# Altium footprint library CONN_USB_C.PcbLib: 30 footprints (part 2 of 2)
Each footprint in its own frame and in the unit in brackets; x right, y up, seen from the top. Pads: shape width x height; smd on the part's side, far side on the other; paste and mask are expansions set on the pad; w line width, h text height; cw(c..) or ccw(c..) is an arc to the next point about the centre after c.
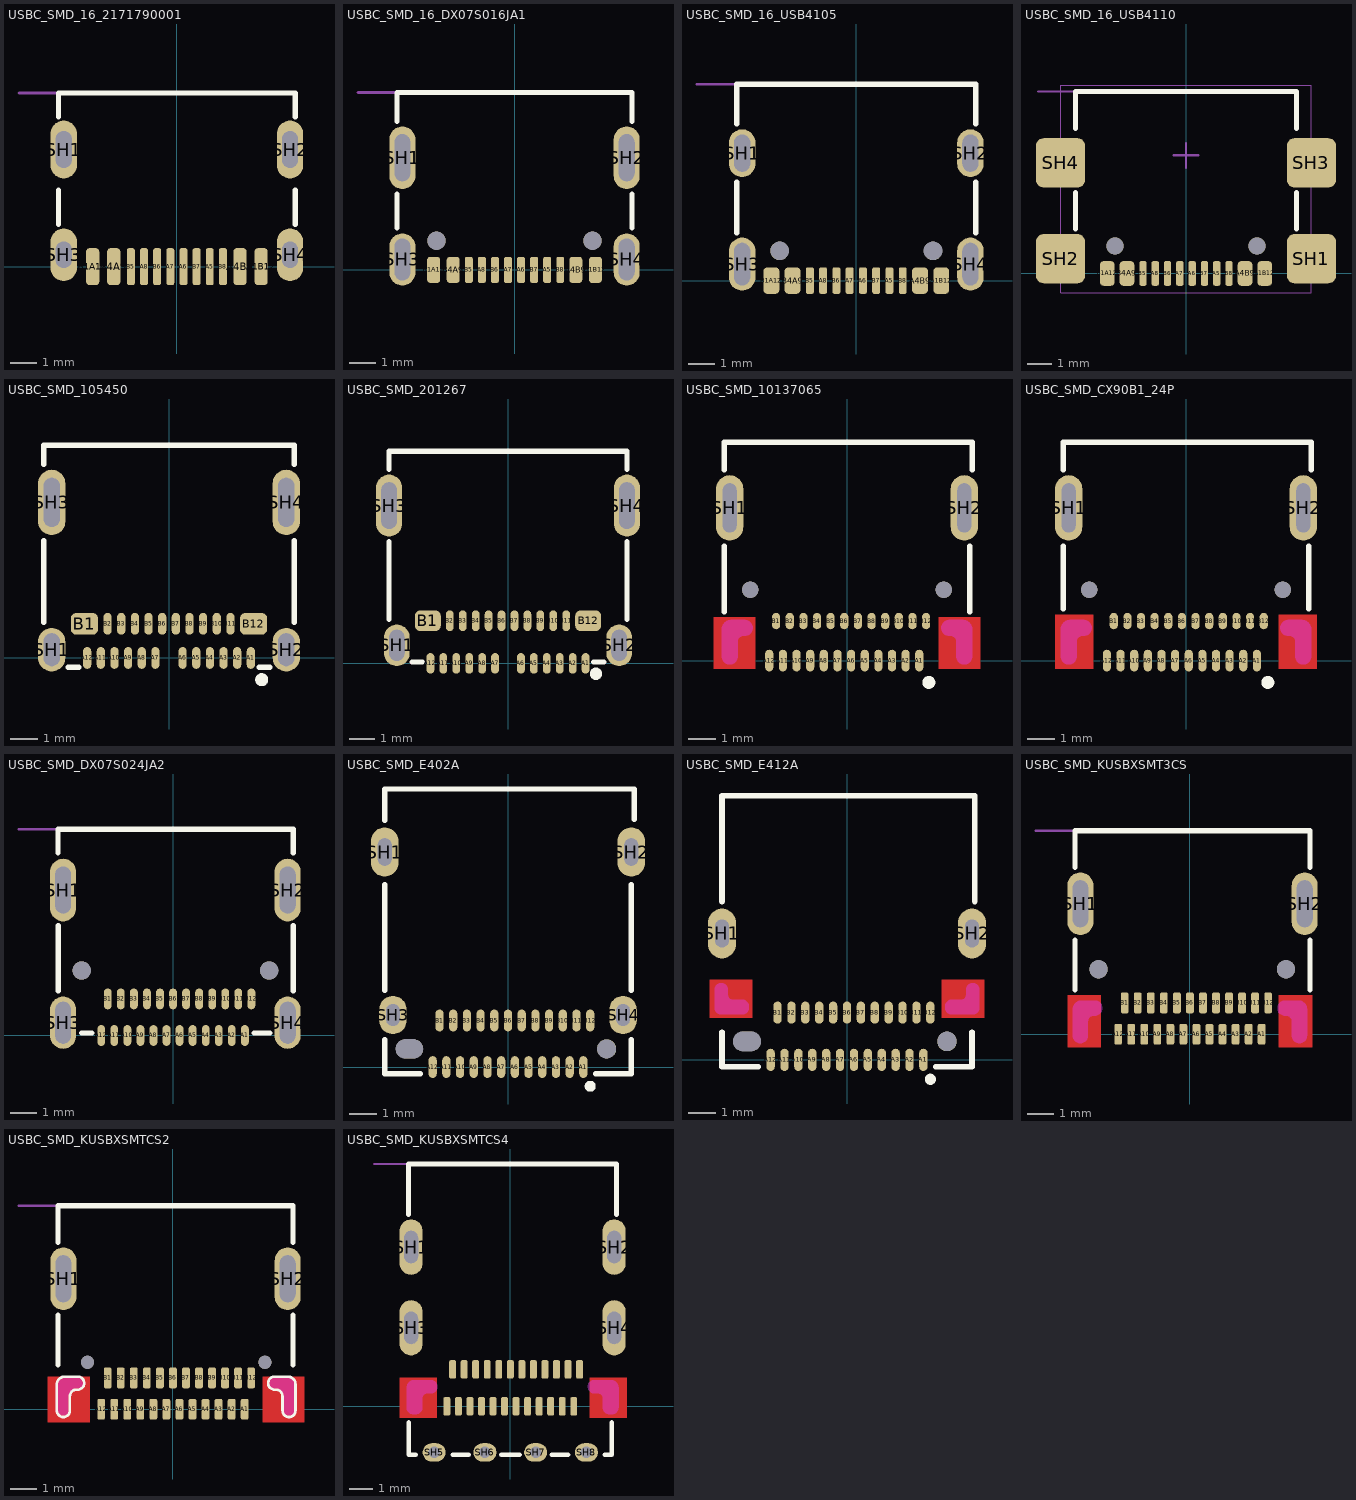
[diagram p1: the footprints below, top view; thin cyan lines are the x and y axes]

## USBC_SMD_16_2171790001 [mm] "CONN, USB, Type C, 2171790001"
height 3.31
pads (16):
  rrect50% 0.5x1.4 smd mask+0.075: A1B12(3.2,0) A4B9(2.4,0) B1A12(-3.2,0) B4A9(-2.4,0)
  rrect50% 0.3x1.4 smd mask+0.075: A5(1.25,0) A6(0.25,0) A7(-0.25,0) A8(-1.25,0) B5(-1.75,0) B6(-0.75,0) B7(0.75,0) B8(1.75,0)
  oval 1x2.2 hole 0.6 slot 1.4 at 90 deg: SH1(-4.3,4.45) SH2(4.3,4.45)
  oval 1x2 hole 0.6 slot 1 at 90 deg: SH3(-4.3,0.45) SH4(4.3,0.45)
Top Overlay:
  lines w0.2: -4.5,1.6 -4.5,2.9 ; -4.5,5.7 -4.5,6.6 4.5,6.6 4.5,5.7 ; 4.5,1.6 4.5,2.9
Mechanical 13:
  lines w0.1: -6,6.6 -4,6.6
  text "PCB EDGE" at -6,7 h0.8
3D body "2171790001.stp": height 3.27, standoff -0.79, extent -4.472,-0.175 4.471,6.575

## USBC_SMD_16_DX07S016JA1 [mm] "CONN, USB, Type C, DX07S016JA1, popular*"
height 3.31
pads (18):
  rrect50% 0.5x1 smd mask+0.075: A1B12(3.1,0) A4B9(2.35,0) B1A12(-3.1,0) B4A9(-2.35,0)
  rrect50% 0.3x1 smd mask+0.075: A5(1.25,0) A6(0.25,0) A7(-0.25,0) A8(-1.25,0) B5(-1.75,0) B6(-0.75,0) B7(0.75,0) B8(1.75,0)
  oval 1x2.4 hole 0.6 slot 1.8 at 90 deg: SH1(-4.3,4.3) SH2(4.3,4.3)
  oval 1x2 hole 0.6 slot 1.6 at 90 deg: SH3(-4.3,0.4) SH4(4.3,0.4)
  round 0.7 hole 0.7 unplated: ""(-2.99,1.12) ""(2.99,1.12)
Top Overlay:
  lines w0.2: -4.5,1.6 -4.5,2.9 ; -4.5,5.7 -4.5,6.8 4.5,6.8 4.5,5.7 ; 4.5,1.6 4.5,2.9
Mechanical 13:
  lines w0.1: -6,6.8 -4,6.8
  text "PCB EDGE" at -6,7.2 h0.8
3D body "DX07S016JA1.STEP": height 3.18, standoff -0.88, extent -4.47,-0.2 4.47,6.7

## USBC_SMD_16_USB4105 [mm] "CONN, USB, Type C, USB4105, popular*"
height 3.31
pads (18):
  rrect50% 0.6x1 smd mask+0.075: A1B12(3.2,0) A4B9(2.4,0) B1A12(-3.2,0) B4A9(-2.4,0)
  rrect50% 0.3x1 smd mask+0.075: A5(1.25,0) A6(0.25,0) A7(-0.25,0) A8(-1.25,0) B5(-1.75,0) B6(-0.75,0) B7(0.75,0) B8(1.75,0)
  oval 1x1.8 hole 0.6 slot 1.4 at 90 deg: SH1(-4.3,4.8) SH2(4.3,4.8)
  oval 1x2 hole 0.6 slot 1.6 at 90 deg: SH3(-4.3,0.62) SH4(4.3,0.62)
  round 0.7 hole 0.7 unplated: ""(-2.89,1.12) ""(2.89,1.12)
Top Overlay:
  lines w0.2: -4.5,1.8 -4.5,3.7 ; -4.5,5.9 -4.5,7.4 4.5,7.4 4.5,5.9 ; 4.5,1.8 4.5,3.7
Mechanical 13:
  lines w0.1: -6,7.4 -4,7.4
  text "PCB EDGE" at -6,7.8 h0.8
3D body "USB4105-15-A.stp": height 3.26, standoff -0.9, extent -4.79,-0.3 4.79,7.408

## USBC_SMD_16_USB4110 [mm] "CONN, USB, Type C, USB4110"
height 3.26
pads (18):
  rrect50% 0.6x1 smd mask+0.075: A1B12(3.2,0) A4B9(2.4,0) B1A12(-3.2,0) B4A9(-2.4,0)
  rrect50% 0.3x1 smd mask+0.075: A5(1.25,0) A6(0.25,0) A7(-0.25,0) A8(-1.25,0) B5(-1.75,0) B6(-0.75,0) B7(0.75,0) B8(1.75,0)
  rrect30% 2x2 smd: SH1(5.1,0.6) SH2(-5.1,0.6) SH3(5.1,4.5) SH4(-5.1,4.5)
  round 0.7 hole 0.7 unplated: ""(-2.89,1.12) ""(2.89,1.12)
Top Overlay:
  lines w0.2: -4.5,1.8 -4.5,3.3 ; -4.5,5.9 -4.5,7.4 4.5,7.4 4.5,5.9 ; 4.5,1.8 4.5,3.3
Mechanical 13:
  lines w0.1: -6,7.4 -4,7.4
  text "PCB EDGE" at -6,7.8 h0.8
Mechanical 15:
  lines w0.05: -5.1,-0.78 -5.1,7.65 5.1,7.65 5.1,-0.78 -5.1,-0.78
  lines w0.1: -0.5,4.8 0.5,4.8 ; 0,4.3 0,5.3
3D body "USB4110-GF-A.stp": height 3.23, standoff -0.72, extent -5.65,-0.28 5.65,7.396

## USBC_SMD_105450 [mm] "CONN, USB, Type C, SMD"
height 2.96
pads (28):
  oval 0.3x0.8 smd mask+0.075: A1(3,0) A2(2.5,0) A3(2,0) A4(1.5,0) A5(1,0) A6(0.5,0) A7(-0.5,0) A8(-1,0) A9(-1.5,0) A10(-2,0) A11(-2.5,0) A12(-3,0) B2(-2.25,1.25) B3(-1.75,1.25) B4(-1.25,1.25) B5(-0.75,1.25) B6(-0.25,1.25) B7(0.25,1.25) B8(0.75,1.25) B9(1.25,1.25) B10(1.75,1.25) B11(2.25,1.25)
  rrect50% 1x0.8 smd mask+0.075: B1(-3.1,1.25) B12(3.1,1.25)
  oval 1x1.6 hole 0.6 slot 1.2 at 90 deg: SH1(-4.3,0.3) SH2(4.3,0.3)
  oval 1x2.4 hole 0.6 slot 1.8 at 90 deg: SH3(-4.3,5.7) SH4(4.3,5.7)
Top Overlay:
  circle w0.25: c3.4,-0.8 r0.114
  lines w0.2: -4.6,1.3 -4.6,4.3 ; -4.6,7.1 -4.6,7.8 4.6,7.8 4.6,7.1 ; -3.7,-0.35 -3.3,-0.35 ; 3.3,-0.35 3.7,-0.35 ; 4.6,1.3 4.6,4.3
3D body "105450-0101.stp": height 3.23, standoff -0.73, extent -4.47,-0.25 4.47,7.65

## USBC_SMD_201267 [mm] "CONN, USB, Type C, SMD"
height 2.96
pads (28):
  oval 0.3x0.8 smd mask+0.075: A1(3,0) A2(2.5,0) A3(2,0) A4(1.5,0) A5(1,0) A6(0.5,0) A7(-0.5,0) A8(-1,0) A9(-1.5,0) A10(-2,0) A11(-2.5,0) A12(-3,0) B2(-2.25,1.65) B3(-1.75,1.65) B4(-1.25,1.65) B5(-0.75,1.65) B6(-0.25,1.65) B7(0.25,1.65) B8(0.75,1.65) B9(1.25,1.65) B10(1.75,1.65) B11(2.25,1.65)
  rrect50% 1x0.8 smd mask+0.075: B1(-3.1,1.65) B12(3.1,1.65)
  oval 1x1.6 hole 0.6 slot 1.2 at 90 deg: SH1(-4.3,0.7) SH2(4.3,0.7)
  oval 1x2.4 hole 0.6 slot 1.8 at 90 deg: SH3(-4.6,6.1) SH4(4.6,6.1)
Top Overlay:
  circle w0.25: c3.4,-0.4 r0.114
  lines w0.2: -4.6,1.7 -4.6,4.7 ; -4.6,7.5 -4.6,8.2 4.6,8.2 4.6,7.5 ; -3.7,0.05 -3.3,0.05 ; 3.3,0.05 3.7,0.05 ; 4.6,1.7 4.6,4.7
3D body "2012670005-000.stp": height 3.72, standoff -2.29, extent -4.695,-0.3 4.695,8

## USBC_SMD_10137065 [mm] "CONN, USB, Type C, SMD"
height 2.96
pads (28):
  oval 0.3x0.8 smd mask+0.075: A1(2.65,0) A2(2.15,0) A3(1.65,0) A4(1.15,0) A5(0.65,0) A6(0.15,0) A7(-0.35,0) A8(-0.85,0) A9(-1.35,0) A10(-1.85,0) A11(-2.35,0) A12(-2.85,0)
  oval 0.3x0.6 smd mask+0.075: B1(-2.6,1.45) B2(-2.1,1.45) B3(-1.6,1.45) B4(-1.1,1.45) B5(-0.6,1.45) B6(-0.1,1.45) B7(0.4,1.45) B8(0.9,1.45) B9(1.4,1.45) B10(1.9,1.45) B11(2.4,1.45) B12(2.9,1.45)
  oval 1x2.4 hole 0.5 slot 1.8 at 90 deg: SH1(-4.3,5.6) SH2(4.3,5.6)
  round 0.6 hole 0.6 unplated: ""(-3.55,2.6) ""(3.55,2.6)
Top Layer:
  rectangle: 3.35,-0.3 4.9,1.6
  region: -3.35,1.6 -4.9,1.6 -4.9,-0.3 -3.35,-0.3
Top Overlay:
  circle w0.25: c3,-0.8 r0.114
  lines w0.2: -4.5,1.8 -4.5,4.2 ; -4.5,7 -4.5,8 4.6,8 4.6,7 ; 4.5,1.8 4.5,4.2
Keep-Out Layer:
  board cut-out: 4.3,-0.1 4.35,-0.1 4.442,-0.062 4.512,0.008 4.55,0.1 4.55,0.15 4.55,1.15 4.55,1.21 4.504,1.32 4.42,1.404 4.31,1.45 4.25,1.45 3.75,1.45 3.7,1.45 3.608,1.412 3.538,1.342 3.5,1.25 3.5,1.2 3.5,1.15 3.538,1.058 3.608,0.988 3.7,0.95 3.75,0.95 3.8,0.95 3.849,0.945 3.939,0.908 4.008,0.839 4.045,0.749 4.05,0.7 4.05,0.15 4.05,0.1 4.088,0.008 4.158,-0.062 4.25,-0.1
  board cut-out: -4.3,-0.1 -4.35,-0.1 -4.442,-0.062 -4.512,0.008 -4.55,0.1 -4.55,0.15 -4.55,1.15 -4.55,1.21 -4.504,1.32 -4.42,1.404 -4.31,1.45 -4.25,1.45 -3.75,1.45 -3.7,1.45 -3.608,1.412 -3.538,1.342 -3.5,1.25 -3.5,1.2 -3.5,1.15 -3.538,1.058 -3.608,0.988 -3.7,0.95 -3.75,0.95 -3.8,0.95 -3.849,0.945 -3.939,0.908 -4.008,0.839 -4.045,0.749 -4.05,0.7 -4.05,0.15 -4.05,0.1 -4.088,0.008 -4.158,-0.062 -4.25,-0.1
  lines w0.1: -4.55,0.15 ccw(c-4.3,0.15) -4.3,-0.1 ccw(c-4.3,0.15) -4.05,0.15 -4.05,0.7 cw(c-3.8,0.7) -3.8,0.95 -3.75,0.95 ccw(c-3.75,1.2) -3.5,1.2 ccw(c-3.75,1.2) -3.75,1.45 -4.25,1.45 ccw(c-4.25,1.15) -4.55,1.15 -4.55,0.15 ; 3.5,1.2 cw(c3.75,1.2) 3.75,1.45 4.25,1.45 cw(c4.25,1.15) 4.55,1.15 4.55,0.15 cw(c4.3,0.15) 4.3,-0.1 cw(c4.3,0.15) 4.05,0.15 4.05,0.7 ccw(c3.8,0.7) 3.8,0.95 3.75,0.95 cw(c3.75,1.2) 3.5,1.2
3D body "10137065..stp": height 3.21, standoff -0.55, extent -4.445,-0.2 4.495,7.95

## USBC_SMD_CX90B1_24P [mm] "CONN, USB, Type C, SMD, CX90B1-24P"
height 2.96
pads (28):
  oval 0.3x0.8 smd mask+0.075: A1(2.6,0) A2(2.1,0) A3(1.6,0) A4(1.1,0) A5(0.6,0) A6(0.1,0) A7(-0.4,0) A8(-0.9,0) A9(-1.4,0) A10(-1.9,0) A11(-2.4,0) A12(-2.9,0)
  oval 0.3x0.6 smd mask+0.075: B1(-2.65,1.45) B2(-2.15,1.45) B3(-1.65,1.45) B4(-1.15,1.45) B5(-0.65,1.45) B6(-0.15,1.45) B7(0.35,1.45) B8(0.85,1.45) B9(1.35,1.45) B10(1.85,1.45) B11(2.35,1.45) B12(2.85,1.45)
  oval 1x2.4 hole 0.5 slot 1.8 at 90 deg: SH1(-4.3,5.6) SH2(4.3,5.6)
  round 0.6 hole 0.6 unplated: ""(-3.55,2.6) ""(3.55,2.6)
Top Layer:
  region: 4.8,1.7 3.4,1.7 3.4,-0.3 4.8,-0.3
  rectangle: -4.8,-0.3 -3.4,1.7
Top Overlay:
  circle w0.25: c3,-0.8 r0.114
  lines w0.2: -4.5,1.9 -4.5,4.2 ; -4.5,7 -4.5,8 4.6,8 4.6,7 ; 4.5,1.9 4.5,4.2
Keep-Out Layer:
  board cut-out: -4.3,-0.1 -4.35,-0.1 -4.442,-0.062 -4.512,0.008 -4.55,0.1 -4.55,0.15 -4.55,1.15 -4.55,1.21 -4.504,1.32 -4.42,1.404 -4.31,1.45 -4.25,1.45 -3.75,1.45 -3.7,1.45 -3.608,1.412 -3.538,1.342 -3.5,1.25 -3.5,1.2 -3.5,1.15 -3.538,1.058 -3.608,0.988 -3.7,0.95 -3.75,0.95 -3.8,0.95 -3.849,0.945 -3.939,0.908 -4.008,0.839 -4.045,0.749 -4.05,0.7 -4.05,0.15 -4.05,0.1 -4.088,0.008 -4.158,-0.062 -4.25,-0.1
  board cut-out: 4.3,-0.1 4.35,-0.1 4.442,-0.062 4.512,0.008 4.55,0.1 4.55,0.15 4.55,1.15 4.55,1.21 4.504,1.32 4.42,1.404 4.31,1.45 4.25,1.45 3.75,1.45 3.7,1.45 3.608,1.412 3.538,1.342 3.5,1.25 3.5,1.2 3.5,1.15 3.538,1.058 3.608,0.988 3.7,0.95 3.75,0.95 3.8,0.95 3.849,0.945 3.939,0.908 4.008,0.839 4.045,0.749 4.05,0.7 4.05,0.15 4.05,0.1 4.088,0.008 4.158,-0.062 4.25,-0.1
  lines w0.1: -4.55,0.15 ccw(c-4.3,0.15) -4.3,-0.1 ccw(c-4.3,0.15) -4.05,0.15 -4.05,0.7 cw(c-3.8,0.7) -3.8,0.95 -3.75,0.95 ccw(c-3.75,1.2) -3.5,1.2 ccw(c-3.75,1.2) -3.75,1.45 -4.25,1.45 ccw(c-4.25,1.15) -4.55,1.15 -4.55,0.15 ; 3.5,1.2 cw(c3.75,1.2) 3.75,1.45 4.25,1.45 cw(c4.25,1.15) 4.55,1.15 4.55,0.15 cw(c4.3,0.15) 4.3,-0.1 cw(c4.3,0.15) 4.05,0.15 4.05,0.7 ccw(c3.8,0.7) 3.8,0.95 3.75,0.95 cw(c3.75,1.2) 3.5,1.2
3D body "CX90B1-24P.stp": height 3.19, standoff -0.57, extent -4.495,-0.2 4.445,7.95

## USBC_SMD_DX07S024JA2 [mm] "CONN, USB, Type C, DX07S024JA2"
height 3.31
pads (30):
  oval 0.3x0.8 smd mask+0.075: A1(2.75,0) A2(2.25,0) A3(1.75,0) A4(1.25,0) A5(0.75,0) A6(0.25,0) A7(-0.25,0) A8(-0.75,0) A9(-1.25,0) A10(-1.75,0) A11(-2.25,0) A12(-2.75,0) B1(-2.5,1.4) B2(-2,1.4) B3(-1.5,1.4) B4(-1,1.4) B5(-0.5,1.4) B6(0,1.4) B7(0.5,1.4) B8(1,1.4) B9(1.5,1.4) B10(2,1.4) B11(2.5,1.4) B12(3,1.4)
  oval 1x2.4 hole 0.6 slot 1.8 at 90 deg: SH1(-4.21,5.57) SH2(4.39,5.57)
  oval 1x2 hole 0.6 slot 1.6 at 90 deg: SH3(-4.21,0.49) SH4(4.39,0.49)
  round 0.7 hole 0.7 unplated: ""(-3.5,2.49) ""(3.68,2.49)
Top Overlay:
  lines w0.2: -4.41,7 -4.41,7.9 4.6,7.9 4.6,7 ; -4.4,1.7 -4.4,4.2 ; -3.5,0.1 -3.1,0.1 ; 3.1,0.1 3.7,0.1 ; 4.6,1.7 4.6,4.2
Mechanical 13:
  lines w0.1: -5.9,7.9 -3.9,7.9
  text "PCB EDGE" at -5.8,8.1 h0.8
3D body "DX07S024JA2.STEP": height 3.17, standoff -1.17, extent -4.355,-0.3 4.585,7.87

## USBC_SMD_E402A [mm] "CONN, USB, Type C, SMD, 12401598E4#2A, 12401610E4#2A"
height 3.2
pads (30):
  oval 0.3x0.8 smd mask+0.075: A1(2.75,0) A2(2.25,0) A3(1.75,0) A4(1.25,0) A5(0.75,0) A6(0.25,0) A7(-0.25,0) A8(-0.75,0) A9(-1.25,0) A10(-1.75,0) A11(-2.25,0) A12(-2.75,0) B1(-2.5,1.7) B2(-2,1.7) B3(-1.5,1.7) B4(-1,1.7) B5(-0.5,1.7) B6(0,1.7) B7(0.5,1.7) B8(1,1.7) B9(1.5,1.7) B10(2,1.7) B11(2.5,1.7) B12(3,1.7)
  oval 1x1.8 hole 0.5 slot 1 at 90 deg: SH1(-4.5,7.85) SH2(4.5,7.85)
  oval 1x1.4 hole 0.5 slot 0.8 at 90 deg: SH3(-4.2,1.9) SH4(4.2,1.9)
  oval 1x0.7 hole 0.7 slot 1 at 0 deg unplated mask+0.05: ""(-3.6,0.665)
  round 0.7 hole 0.7 unplated mask+0.05: ""(3.6,0.665)
Top Overlay:
  circle w0.2: c3,-0.7 r0.1
  lines w0.2: -4.5,1 -4.5,-0.25 -3.2,-0.25 ; -4.5,2.8 -4.5,6.65 ; -4.5,9 -4.5,10.15 4.6,10.15 4.6,9.05 ; 3.2,-0.25 4.5,-0.25 4.5,1 ; 4.5,2.8 4.5,6.65
3D body "12401610E4#2A.step": height 3.3, standoff -1.28, extent -4.6,-0.3 4.6,10.25

## USBC_SMD_E412A [mm] "CONN, USB, Type C, SMD, 12401899E412A"
height 3.2
pads (28):
  oval 0.3x0.8 smd mask+0.075: A1(2.75,0) A2(2.25,0) A3(1.75,0) A4(1.25,0) A5(0.75,0) A6(0.25,0) A7(-0.25,0) A8(-0.75,0) A9(-1.25,0) A10(-1.75,0) A11(-2.25,0) A12(-2.75,0) B1(-2.5,1.7) B2(-2,1.7) B3(-1.5,1.7) B4(-1,1.7) B5(-0.5,1.7) B6(0,1.7) B7(0.5,1.7) B8(1,1.7) B9(1.5,1.7) B10(2,1.7) B11(2.5,1.7) B12(3,1.7)
  oval 1x1.8 hole 0.5 slot 1 at 90 deg: SH1(-4.5,4.55) SH2(4.5,4.55)
  oval 1x0.7 hole 0.7 slot 1 at 0 deg unplated mask+0.05: ""(-3.6,0.665)
  round 0.7 hole 0.7 unplated mask+0.05: ""(3.6,0.665)
Top Layer:
  rectangle: -4.95,1.5 -3.4,2.9
  region: 4.95,2.9 3.4,2.9 3.4,1.5 4.95,1.5
Top Overlay:
  circle w0.2: c3,-0.7 r0.1
  lines w0.2: -4.5,1 -4.5,-0.25 -3.2,-0.25 ; -4.5,5.7 -4.5,9.5 4.6,9.5 4.6,5.7 ; 3.2,-0.25 4.5,-0.25 4.5,1
Keep-Out Layer:
  board cut-out: 4.525,1.675 4.565,1.675 4.638,1.705 4.695,1.762 4.725,1.835 4.725,1.875 4.725,2.525 4.725,2.565 4.695,2.638 4.638,2.695 4.565,2.725 4.525,2.725 4.485,2.725 4.412,2.695 4.355,2.638 4.325,2.565 4.325,2.525 4.325,2.325 4.321,2.286 4.291,2.214 4.236,2.159 4.164,2.129 4.125,2.125 3.775,2.125 3.735,2.125 3.662,2.095 3.605,2.038 3.575,1.965 3.575,1.925 3.575,1.875 3.575,1.835 3.605,1.762 3.662,1.705 3.735,1.675 3.775,1.675
  board cut-out: -4.525,1.675 -4.565,1.675 -4.638,1.705 -4.695,1.762 -4.725,1.835 -4.725,1.875 -4.725,2.525 -4.725,2.565 -4.695,2.638 -4.638,2.695 -4.565,2.725 -4.525,2.725 -4.485,2.725 -4.412,2.695 -4.355,2.638 -4.325,2.565 -4.325,2.525 -4.325,2.325 -4.321,2.286 -4.291,2.214 -4.236,2.159 -4.164,2.129 -4.125,2.125 -3.775,2.125 -3.735,2.125 -3.662,2.095 -3.605,2.038 -3.575,1.965 -3.575,1.925 -3.575,1.875 -3.575,1.835 -3.605,1.762 -3.662,1.705 -3.735,1.675 -3.775,1.675
  lines w0.1: -4.725,1.875 ccw(c-4.525,1.875) -4.525,1.675 -3.775,1.675 ccw(c-3.775,1.875) -3.575,1.875 -3.575,1.925 ccw(c-3.775,1.925) -3.775,2.125 -4.125,2.125 cw(c-4.125,2.325) -4.325,2.325 -4.325,2.525 ccw(c-4.525,2.525) -4.525,2.725 ccw(c-4.525,2.525) -4.725,2.525 -4.725,1.875 ; 3.575,1.875 ccw(c3.775,1.875) 3.775,1.675 4.525,1.675 ccw(c4.525,1.875) 4.725,1.875 4.725,2.525 ccw(c4.525,2.525) 4.525,2.725 ccw(c4.525,2.525) 4.325,2.525 4.325,2.325 cw(c4.125,2.325) 4.125,2.125 3.775,2.125 ccw(c3.775,1.925) 3.575,1.925 3.575,1.875
3D body "12401899.stp": height 3.45, standoff -0.9, extent -4.59,-0.3 4.59,9.35

## USBC_SMD_KUSBXSMT3CS [mm] "CONN, USB, Type C, KUSBX-SMT3-CS"
height 3.31
pads (28):
  rrect50% 0.3x0.8 smd mask+0.075: A1(2.75,0) A2(2.25,0) A3(1.75,0) A4(1.25,0) A5(0.75,0) A6(0.25,0) A7(-0.25,0) A8(-0.75,0) A9(-1.25,0) A10(-1.75,0) A11(-2.25,0) A12(-2.75,0) B1(-2.5,1.2) B2(-2,1.2) B3(-1.5,1.2) B4(-1,1.2) B5(-0.5,1.2) B6(0,1.2) B7(0.5,1.2) B8(1,1.2) B9(1.5,1.2) B10(2,1.2) B11(2.5,1.2) B12(3,1.2)
  oval 1x2.4 hole 0.6 slot 1.8 at 90 deg: SH1(-4.2,5) SH2(4.4,5)
  round 0.7 hole 0.7 unplated: ""(-3.5,2.49) ""(3.68,2.49)
Top Layer:
  rectangle: -4.7,-0.5 -3.4,1.5
  region: 4.7,1.5 3.4,1.5 3.4,-0.5 4.7,-0.5
Top Overlay:
  lines w0.2: -4.41,6.4 -4.41,7.8 4.6,7.8 4.6,6.4 ; -4.4,1.7 -4.4,3.6 ; 4.6,1.7 4.6,3.6
Keep-Out Layer:
  board cut-out: -4.2,-0.3 -4.25,-0.3 -4.342,-0.262 -4.412,-0.192 -4.45,-0.1 -4.45,-0.05 -4.45,0.95 -4.45,1.01 -4.404,1.12 -4.32,1.204 -4.21,1.25 -4.15,1.25 -3.65,1.25 -3.6,1.25 -3.508,1.212 -3.438,1.142 -3.4,1.05 -3.4,1 -3.4,0.95 -3.438,0.858 -3.508,0.788 -3.6,0.75 -3.65,0.75 -3.7,0.75 -3.749,0.745 -3.839,0.708 -3.908,0.639 -3.945,0.549 -3.95,0.5 -3.95,-0.05 -3.95,-0.1 -3.988,-0.192 -4.058,-0.262 -4.15,-0.3
  board cut-out: 4.2,-0.3 4.25,-0.3 4.342,-0.262 4.412,-0.192 4.45,-0.1 4.45,-0.05 4.45,0.95 4.45,1.01 4.404,1.12 4.32,1.204 4.21,1.25 4.15,1.25 3.65,1.25 3.6,1.25 3.508,1.212 3.438,1.142 3.4,1.05 3.4,1 3.4,0.95 3.438,0.858 3.508,0.788 3.6,0.75 3.65,0.75 3.7,0.75 3.749,0.745 3.839,0.708 3.908,0.639 3.945,0.549 3.95,0.5 3.95,-0.05 3.95,-0.1 3.988,-0.192 4.058,-0.262 4.15,-0.3
  lines w0.1: -4.45,-0.05 ccw(c-4.2,-0.05) -4.2,-0.3 ccw(c-4.2,-0.05) -3.95,-0.05 -3.95,0.5 cw(c-3.7,0.5) -3.7,0.75 -3.65,0.75 ccw(c-3.65,1) -3.4,1 ccw(c-3.65,1) -3.65,1.25 -4.15,1.25 ccw(c-4.15,0.95) -4.45,0.95 -4.45,-0.05 ; 3.4,1 cw(c3.65,1) 3.65,1.25 4.15,1.25 cw(c4.15,0.95) 4.45,0.95 4.45,-0.05 cw(c4.2,-0.05) 4.2,-0.3 cw(c4.2,-0.05) 3.95,-0.05 3.95,0.5 ccw(c3.7,0.5) 3.7,0.75 3.65,0.75 cw(c3.65,1) 3.4,1
Mechanical 13:
  lines w0.1: -5.9,7.8 -3.9,7.8
  text "PCB EDGE" at -5.8,8 h0.8
3D body "KUSBX-SMT3-CS.STEP": height 3.21, standoff -1.95, extent -4.345,-0.4 4.595,7.7

## USBC_SMD_KUSBXSMTCS2 [mm] "CONN, USB, Type C, KUSBX-SMT-CS2"
height 3.31
pads (28):
  rrect50% 0.3x0.8 smd mask+0.075: A1(2.75,0) A2(2.25,0) A3(1.75,0) A4(1.25,0) A5(0.75,0) A6(0.25,0) A7(-0.25,0) A8(-0.75,0) A9(-1.25,0) A10(-1.75,0) A11(-2.25,0) A12(-2.75,0) B1(-2.5,1.2) B2(-2,1.2) B3(-1.5,1.2) B4(-1,1.2) B5(-0.5,1.2) B6(0,1.2) B7(0.5,1.2) B8(1,1.2) B9(1.5,1.2) B10(2,1.2) B11(2.5,1.2) B12(3,1.2)
  oval 1x2.4 hole 0.6 slot 1.8 at 90 deg: SH1(-4.2,5) SH2(4.4,5)
  round 0.5 hole 0.5 unplated: ""(-3.275,1.8) ""(3.525,1.8)
Top Layer:
  region: 5.05,1.25 3.425,1.25 3.425,-0.5 5.05,-0.5
  rectangle: -4.8,-0.5 -3.175,1.25
Top Overlay:
  lines w0.1: -4.45,-0.05 ccw(c-4.2,-0.05) -4.2,-0.3 ccw(c-4.2,-0.05) -3.95,-0.05 -3.95,0.5 cw(c-3.7,0.5) -3.7,0.75 -3.65,0.75 ccw(c-3.65,1) -3.4,1 ccw(c-3.65,1) -3.65,1.25 -4.15,1.25 ccw(c-4.15,0.95) -4.45,0.95 -4.45,-0.05 ; 3.65,1 cw(c3.9,1) 3.9,1.25 4.4,1.25 cw(c4.4,0.95) 4.7,0.95 4.7,-0.05 cw(c4.45,-0.05) 4.45,-0.3 cw(c4.45,-0.05) 4.2,-0.05 4.2,0.5 ccw(c3.95,0.5) 3.95,0.75 3.9,0.75 cw(c3.9,1) 3.65,1
  lines w0.2: -4.41,6.4 -4.41,7.8 4.6,7.8 4.6,6.4 ; -4.4,1.7 -4.4,3.6 ; 4.6,1.7 4.6,3.6
Keep-Out Layer:
  board cut-out: -4.2,-0.3 -4.25,-0.3 -4.342,-0.262 -4.412,-0.192 -4.45,-0.1 -4.45,-0.05 -4.45,0.95 -4.45,1.01 -4.404,1.12 -4.32,1.204 -4.21,1.25 -4.15,1.25 -3.65,1.25 -3.6,1.25 -3.508,1.212 -3.438,1.142 -3.4,1.05 -3.4,1 -3.4,0.95 -3.438,0.858 -3.508,0.788 -3.6,0.75 -3.65,0.75 -3.7,0.75 -3.749,0.745 -3.839,0.708 -3.908,0.639 -3.945,0.549 -3.95,0.5 -3.95,-0.05 -3.95,-0.1 -3.988,-0.192 -4.058,-0.262 -4.15,-0.3
  board cut-out: 4.45,-0.3 4.5,-0.3 4.592,-0.262 4.662,-0.192 4.7,-0.1 4.7,-0.05 4.7,0.95 4.7,1.01 4.654,1.12 4.57,1.204 4.46,1.25 4.4,1.25 3.9,1.25 3.85,1.25 3.758,1.212 3.688,1.142 3.65,1.05 3.65,1 3.65,0.95 3.688,0.858 3.758,0.788 3.85,0.75 3.9,0.75 3.95,0.75 3.999,0.745 4.089,0.708 4.158,0.639 4.195,0.549 4.2,0.5 4.2,-0.05 4.2,-0.1 4.238,-0.192 4.308,-0.262 4.4,-0.3
Mechanical 13:
  lines w0.1: -5.9,7.8 -3.9,7.8
  text "PCB EDGE" at -5.8,8 h0.8
3D body "KUSBX-SMT-CS2.STEP": height 3.18, standoff -0.58, extent -4.345,-0.4 4.595,7.7

## USBC_SMD_KUSBXSMTCS4 [mm] "CONN, USB, Type C, KUSBX-SMT-CS4"
height 3.2
pads (32):
  rrect50% 0.3x0.8 smd mask+0.075: A1(2.75,0) A2(2.25,0) A3(1.75,0) A4(1.25,0) A5(0.75,0) A6(0.25,0) A7(-0.25,0) A8(-0.75,0) A9(-1.25,0) A10(-1.75,0) A11(-2.25,0) A12(-2.75,0) B1(-2.5,1.6) B2(-2,1.6) B3(-1.5,1.6) B4(-1,1.6) B5(-0.5,1.6) B6(0,1.6) B7(0.5,1.6) B8(1,1.6) B9(1.5,1.6) B10(2,1.6) B11(2.5,1.6) B12(3,1.6)
  oval 1x2.4 hole 0.6 slot 1.4 at 90 deg: SH1(-4.3,6.9) SH2(4.5,6.9) SH3(-4.3,3.4) SH4(4.5,3.4)
  oval 1x0.8 hole 0.5: SH5(-3.3,-2) SH6(-1.1,-2) SH7(1.1,-2) SH8(3.3,-2)
Top Layer:
  region: 5.05,1.25 3.425,1.25 3.425,-0.5 5.05,-0.5
  rectangle: -4.8,-0.5 -3.175,1.25
Top Overlay:
  lines w0.2: -4.41,8.3 -4.41,10.5 4.6,10.5 4.6,8.3 ; -4.4,-0.7 -4.4,-2.1 -4.1,-2.1 ; -2.5,-2.1 -1.8,-2.1 ; -0.4,-2.1 0.4,-2.1 ; 1.8,-2.1 2.5,-2.1 ; 4.1,-2.1 4.4,-2.1 4.4,-0.7
Keep-Out Layer:
  board cut-out: -4.2,-0.3 -4.25,-0.3 -4.342,-0.262 -4.412,-0.192 -4.45,-0.1 -4.45,-0.05 -4.45,0.8 -4.45,0.86 -4.404,0.97 -4.32,1.054 -4.21,1.1 -4.15,1.1 -3.45,1.1 -3.4,1.1 -3.308,1.062 -3.238,0.992 -3.2,0.9 -3.2,0.85 -3.2,0.8 -3.238,0.708 -3.308,0.638 -3.4,0.6 -3.45,0.6 -3.6,0.6 -3.649,0.595 -3.739,0.558 -3.808,0.489 -3.845,0.399 -3.85,0.35 -3.85,-0.05 -3.85,-0.1 -3.888,-0.192 -3.958,-0.262 -4.05,-0.3 -4.1,-0.3
  board cut-out: 4.4,-0.3 4.45,-0.3 4.542,-0.262 4.612,-0.192 4.65,-0.1 4.65,-0.05 4.65,0.8 4.65,0.86 4.604,0.97 4.52,1.054 4.41,1.1 4.35,1.1 3.65,1.1 3.6,1.1 3.508,1.062 3.438,0.992 3.4,0.9 3.4,0.85 3.4,0.8 3.438,0.708 3.508,0.638 3.6,0.6 3.65,0.6 3.8,0.6 3.849,0.595 3.939,0.558 4.008,0.489 4.045,0.399 4.05,0.35 4.05,-0.05 4.05,-0.1 4.088,-0.192 4.158,-0.262 4.25,-0.3 4.3,-0.3
  lines w0.1: -4.45,-0.05 ccw(c-4.2,-0.05) -4.2,-0.3 -4.1,-0.3 ccw(c-4.1,-0.05) -3.85,-0.05 -3.85,0.35 cw(c-3.6,0.35) -3.6,0.6 -3.45,0.6 ccw(c-3.45,0.85) -3.2,0.85 ccw(c-3.45,0.85) -3.45,1.1 -4.15,1.1 ccw(c-4.15,0.8) -4.45,0.8 -4.45,-0.05 ; 3.4,0.85 cw(c3.65,0.85) 3.65,1.1 4.35,1.1 cw(c4.35,0.8) 4.65,0.8 4.65,-0.05 cw(c4.4,-0.05) 4.4,-0.3 4.3,-0.3 cw(c4.3,-0.05) 4.05,-0.05 4.05,0.35 ccw(c3.8,0.35) 3.8,0.6 3.65,0.6 cw(c3.65,0.85) 3.4,0.85
Mechanical 13:
  lines w0.1: -5.9,10.5 -3.9,10.5
  text "PCB EDGE" at -5.8,10.7 h0.8
3D body "KUSBX-SMT-CS4.STEP": height 3.23, standoff -1.18, extent -4.395,-2.04 4.645,10.4